# Altium footprint library ALL.PcbLib: 385 footprints (part 20 of 25)
Each footprint in its own frame and in the unit in brackets; x right, y up, seen from the top. Pads: shape width x height; smd on the part's side, far side on the other; paste and mask are expansions set on the pad; w line width, h text height; cw(c..) or ccw(c..) is an arc to the next point about the centre after c.
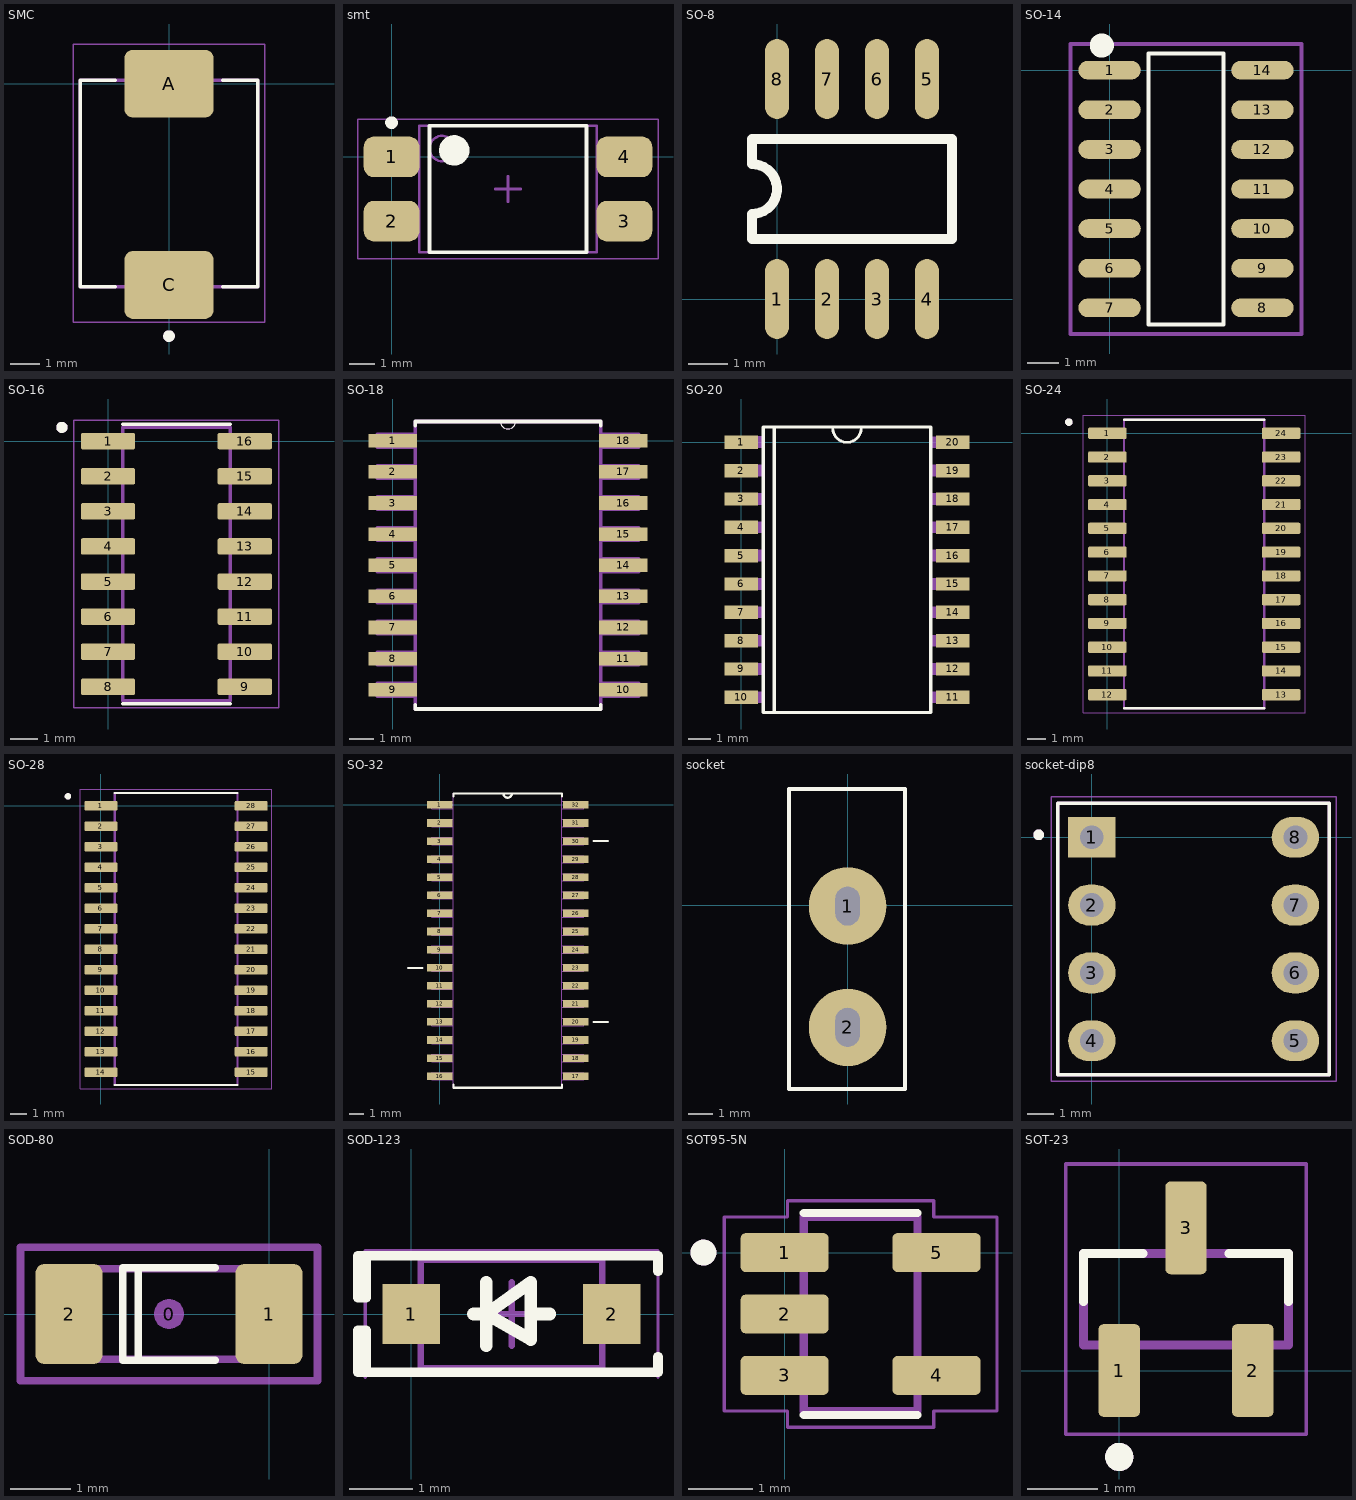
[diagram p19: the footprints below, top view; thin cyan lines are the x and y axes]

## SMC [mm]
pads (2):
  rrect25% 3.07x2.33 smd: A(0,0) C(0,-6.921)
Top Overlay:
  circle w0.2: c0,-8.679 r0.1
  lines w0.127: -1.849,-6.979 -3.05,-6.979 -3.05,0.121 -1.849,0.121 ; 1.849,-6.979 3.05,-6.979 3.05,0.121 1.849,0.121
Mechanical 13:
  circle w0.2: c0,-8.679 r0.1
  lines w0.127: -3.05,-6.979 -3.05,0.121 3.05,0.121 3.05,-6.979 -3.05,-6.979
Mechanical 15:
  lines w0.05: -3.3,-8.209 3.3,-8.209 3.3,1.351 -3.3,1.351 -3.3,-8.209
3D body "b540c-13-f.stp": height 2.25, standoff 0, extent -2.921,-7.526 2.984,0.414

## smt [mm]
pads (4):
  rrect50% 2.2x1.6 smd mask+0.06: 1(0,0) 2(0,-2.54) 3(9.2,-2.54) 4(9.2,0)
Top Overlay:
  circle w0.25: c0,1.35 r0.125
  circle w0.6: c2.475,0.255 r0.3
  lines w0.15: 1.5,-3.77 1.5,1.23 7.7,1.23 7.7,-3.77 1.5,-3.77
Mechanical 13:
  circle w0.1: c2,0.33 r0.5
  lines w0.1: 1.1,-3.77 1.1,1.23 8.1,1.23 8.1,-3.77 1.1,-3.77
Mechanical 15:
  lines w0.05: -1.325,-4.02 -1.325,1.48 10.525,1.48 10.525,-4.02 -1.325,-4.02
  lines w0.1: 4.1,-1.27 5.1,-1.27 ; 4.6,-1.77 4.6,-0.77
3D body "User Library-PC817_Gullwing.STEP": height 3.89, standoff 0.04, extent -0.4,-3.56 9.6,1.02

## SO-8 [mil]
pads (8):
  oval 24x80 smd: 1(0,0) 2(50,0) 3(100,0) 4(150,0) 5(150,220) 6(100,220) 7(50,220) 8(0,220)
Top Overlay:
  lines w10: -25,60 -25,85 ccw(c-25,110) -25,135 -25,160 175,160 175,60 -25,60
3D body "SW3DPS-SO-8 (PIC12FXXX)-DEFAULT.STEP": height 63.6, standoff 0.6, extent -19.8,-12.42 173.11,223.41

## SO-14 [mm]
pads (14):
  oval 2x0.6 smd: 1(0,0) 2(0,-1.27) 3(0,-2.54) 4(0,-3.81) 5(0,-5.08) 6(0,-6.35) 7(0,-7.62) 8(4.9,-7.62) 9(4.9,-6.35) 10(4.9,-5.08) 11(4.9,-3.81) 12(4.9,-2.54) 13(4.9,-1.27) 14(4.9,0)
Top Overlay:
  circle w0.61: c-0.25,0.79 r0.08
  lines w0.127: 1.25,-8.16 1.25,0.54 3.65,0.54 3.65,-8.16 1.25,-8.16
Mechanical 15:
  lines w0.127: -1.25,-8.46 6.15,-8.46 6.15,0.84 -1.25,0.84 -1.25,-8.46
3D body "User Library-SOIC14-150.STEP": height 1.75, standoff 0, extent -0.36,-8.085 5.44,0.465

## SO-16 [mm]
pads (16):
  rrect25% 1.97x0.6 smd: 1(0,0) 2(0,-1.27) 3(0,-2.54) 4(0,-3.81) 5(0,-5.08) 6(0,-6.35) 7(0,-7.62) 8(0,-8.89) 9(4.95,-8.89) 10(4.95,-7.62) 11(4.95,-6.35) 12(4.95,-5.08) 13(4.95,-3.81) 14(4.95,-2.54) 15(4.95,-1.27) 16(4.95,0)
Top Overlay:
  circle w0.2: c-1.67,0.5 r0.1
  lines w0.127: 0.525,-9.51 4.425,-9.51 ; 0.525,0.62 4.425,0.62
Mechanical 13:
  circle w0.2: c-1.67,0.5 r0.1
  lines w0.127: 0.525,-9.395 0.525,0.505 4.425,0.505 4.425,-9.395 0.525,-9.395
Mechanical 15:
  lines w0.05: -1.235,-9.645 -1.235,0.755 6.185,0.755 6.185,-9.645 -1.235,-9.645
3D body "User Library-SOIC-16-1.STEP": height 1.4, standoff 0, extent -0.46,-9.395 5.54,0.505

## SO-18 [mil]
pads (18):
  rect 78x22 smd: 1(0,0) 2(0,-50) 3(0,-100) 4(0,-150) 5(0,-200) 6(0,-250) 7(0,-300) 8(0,-350) 9(0,-400) 10(370,-400) 11(370,-350) 12(370,-300) 13(370,-250) 14(370,-200) 15(370,-150) 16(370,-100) 17(370,-50) 18(370,0)
Top Overlay:
  lines w0: 173,31 ccw(c185,31) 197,31
  lines w6: 36,-424 36,-431 334,-431 334,-424 ; 36,24 36,31 173,31 197,31 334,31 334,24
Mechanical 13:
  lines w0: 173,31 ccw(c185,31) 197,31
  lines w6: -25,-410 36,-410 36,-390 -25,-390 -25,-410 ; -25,-360 36,-360 36,-340 -25,-340 -25,-360 ; -25,-310 36,-310 36,-290 -25,-290 -25,-310 ; -25,-260 36,-260 36,-240 -25,-240 -25,-260 ; -25,-210 36,-210 36,-190 -25,-190 -25,-210 ; -25,-160 36,-160 36,-140 -25,-140 -25,-160 ; -25,-110 36,-110 36,-90 -25,-90 -25,-110 ; -25,-60 36,-60 36,-40 -25,-40 -25,-60 ; -25,-10 36,-10 36,10 -25,10 -25,-10 ; 36,-431 36,31 173,31 197,31 334,31 334,-431 36,-431 ; 334,-410 395,-410 395,-390 334,-390 334,-410 ; 334,-360 395,-360 395,-340 334,-340 334,-360 ; 334,-310 395,-310 395,-290 334,-290 334,-310 ; 334,-260 395,-260 395,-240 334,-240 334,-260 ; 334,-210 395,-210 395,-190 334,-190 334,-210 ; 334,-160 395,-160 395,-140 334,-140 334,-160 ; 334,-110 395,-110 395,-90 334,-90 334,-110 ; 334,-60 395,-60 395,-40 334,-40 334,-60 ; 334,-10 395,-10 395,10 334,10 334,-10
3D body "82YWM--3DModel-STEP-56544.STEP": height 102.99, standoff 0, extent -18,-428.49 388.02,28.51

## SO-20 [mm]
pads (20):
  rect 1.5x0.6 smd: 1(0,0) 2(0,-1.27) 3(0,-2.54) 4(0,-3.81) 5(0,-5.08) 6(0,-6.35) 7(0,-7.62) 8(0,-8.89) 9(0,-10.16) 10(0,-11.43) 11(9.5,-11.43) 12(9.5,-10.16) 13(9.5,-8.89) 14(9.5,-7.62) 15(9.5,-6.35) 16(9.5,-5.08) 17(9.5,-3.81) 18(9.5,-2.54) 19(9.5,-1.27) 20(9.5,0)
Top Overlay:
  lines w0.127: 4.115,0.635 ccw(c4.75,0.635) 5.385,0.635
  lines w0.152: 1.48,-12.115 1.48,0.685 ; 1.48,-12.115 8.5,-12.115 8.5,0.685 1.48,0.685 ; 1.48,-12.115 1,-12.115 1,0.685 1.48,0.685
Mechanical 13:
  region: -0.008,-0.254 -0.008,0.264 1,0.264 1,-0.254
  region: -0.002,-11.684 -0.002,-11.178 1,-11.178 1,-11.684
  region: 8.504,-0.254 8.504,0.261 9.5,0.261 9.5,-0.254
  region: 8.506,-11.684 8.506,-11.185 9.5,-11.185 9.5,-11.684
  region: -0.006,-10.414 -0.006,-9.911 1,-9.911 1,-10.414
  region: -0.007,-9.144 -0.007,-8.641 1,-8.641 1,-9.144
  region: -0.008,-7.874 -0.008,-7.369 1,-7.369 1,-7.874
  region: -0.009,-6.604 -0.009,-6.097 1,-6.097 1,-6.604
  region: -0.001,-1.524 -0.001,-1.015 1,-1.015 1,-1.524
  region: -0.003,-2.794 -0.003,-2.284 1,-2.284 1,-2.794
  region: -0.002,-4.064 -0.002,-3.555 1,-3.555 1,-4.064
  region: -0.003,-5.334 -0.003,-4.825 1,-4.825 1,-5.334
  region: 8.502,-10.414 8.502,-9.908 9.5,-9.908 9.5,-10.414
  region: 8.503,-9.144 8.503,-8.638 9.5,-8.638 9.5,-9.144
  region: 8.502,-7.874 8.502,-7.367 9.5,-7.367 9.5,-7.874
  region: 8.501,-6.604 8.501,-6.096 9.5,-6.096 9.5,-6.604
  region: 8.502,-1.524 8.502,-1.013 9.5,-1.013 9.5,-1.524
  region: 8.507,-2.794 8.507,-2.279 9.5,-2.279 9.5,-2.794
  region: 8.505,-4.064 8.505,-3.553 9.5,-3.553 9.5,-4.064
  region: 8.503,-5.334 8.503,-4.825 9.5,-4.825 9.5,-5.334
3D body "User Library-SOIC20.STEP": height 2.32, standoff 0.08, extent -0.368,-12.142 9.766,0.458

## SO-24 [mm]
pads (24):
  rrect25% 2.06x0.6 smd: 1(0,0) 2(0,-1.27) 3(0,-2.54) 4(0,-3.81) 5(0,-5.08) 6(0,-6.35) 7(0,-7.62) 8(0,-8.89) 9(0,-10.16) 10(0,-11.43) 11(0,-12.7) 12(0,-13.97) 13(9.28,-13.97) 14(9.28,-12.7) 15(9.28,-11.43) 16(9.28,-10.16) 17(9.28,-8.89) 18(9.28,-7.62) 19(9.28,-6.35) 20(9.28,-5.08) 21(9.28,-3.81) 22(9.28,-2.54) 23(9.28,-1.27) 24(9.28,0)
Top Overlay:
  circle w0.2: c-2.06,0.6 r0.1
  lines w0.127: 0.89,-14.685 8.39,-14.685 ; 0.89,0.715 8.39,0.715
Mechanical 13:
  circle w0.2: c-2.06,0.6 r0.1
  lines w0.127: 0.89,-14.685 0.89,0.715 8.39,0.715 8.39,-14.685 0.89,-14.685
Mechanical 15:
  lines w0.05: -1.28,-14.935 -1.28,0.965 10.56,0.965 10.56,-14.935 -1.28,-14.935
3D body "User Library-SOIC_24-300.STEP": height 2.6, standoff 0, extent -0.508,-14.812 9.892,0.588

## SO-28 [mm]
pads (28):
  rrect25% 2.05x0.59 smd: 1(0,0) 2(0,-1.27) 3(0,-2.54) 4(0,-3.81) 5(0,-5.08) 6(0,-6.35) 7(0,-7.62) 8(0,-8.89) 9(0,-10.16) 10(0,-11.43) 11(0,-12.7) 12(0,-13.97) 13(0,-15.24) 14(0,-16.51) 15(9.31,-16.51) 16(9.31,-15.24) 17(9.31,-13.97) 18(9.31,-12.7) 19(9.31,-11.43) 20(9.31,-10.16) 21(9.31,-8.89) 22(9.31,-7.62) 23(9.31,-6.35) 24(9.31,-5.08) 25(9.31,-3.81) 26(9.31,-2.54) 27(9.31,-1.27) 28(9.31,0)
Top Overlay:
  circle w0.2: c-2.05,0.59 r0.1
  lines w0.127: 0.855,-17.305 8.455,-17.305 ; 0.855,0.795 8.455,0.795
Mechanical 13:
  circle w0.2: c-2.05,0.59 r0.1
  lines w0.127: 0.855,-17.305 8.455,-17.305 8.455,0.795 0.855,0.795 0.855,-17.305
Mechanical 15:
  lines w0.05: -1.275,-17.555 10.585,-17.555 10.585,1.045 -1.275,1.045 -1.275,-17.555
3D body "User Library-SOIC28-300.STEP": height 2.65, standoff 0, extent -0.578,-17.205 9.722,0.695

## SO-32 [mil]
pads (32):
  rect 71x21 smd: 1(0,-1) 2(0,-51) 3(0,-101) 4(0,-151) 5(0,-201) 6(0,-251) 7(0,-301) 8(0,-351) 9(0,-401) 10(0,-451) 11(0,-501) 12(0,-551) 13(0,-601) 14(0,-651) 15(0,-701) 16(0,-751) 17(376,-751) 18(376,-701) 19(376,-651) 20(376,-601) 21(376,-551) 22(376,-501) 23(376,-451) 24(376,-401) 25(376,-351) 26(376,-301) 27(376,-251) 28(376,-201) 29(376,-151) 30(376,-101) 31(376,-51) 32(376,-1)
Top Overlay:
  lines w6: -87,-452 -48,-452 ; 38,-774 38,-783 338,-783 338,-774 ; 38,22 38,31 176,31 ; 338,22 338,31 200,31 ; 425,-601 465,-601 ; 425,-101 465,-101 ; 176,31 ccw(c188,31) 200,31 ; 176,31 200,31
Mechanical 13:
  lines w0: 176,31 ccw(c188,31) 200,31 ; 176,31 38,31 38,-783 338,-783 338,31 200,31 ; 176,31 200,31 ; -22,-761 38,-761 38,-741 -22,-741 -22,-761 ; -22,-711 38,-711 38,-691 -22,-691 -22,-711 ; -22,-661 38,-661 38,-641 -22,-641 -22,-661 ; -22,-611 38,-611 38,-591 -22,-591 -22,-611 ; -22,-561 38,-561 38,-541 -22,-541 -22,-561 ; -22,-511 38,-511 38,-491 -22,-491 -22,-511 ; -22,-461 38,-461 38,-441 -22,-441 -22,-461 ; -22,-411 38,-411 38,-391 -22,-391 -22,-411 ; -22,-361 38,-361 38,-341 -22,-341 -22,-361 ; -22,-311 38,-311 38,-291 -22,-291 -22,-311 ; -22,-261 38,-261 38,-241 -22,-241 -22,-261 ; -22,-211 38,-211 38,-191 -22,-191 -22,-211 ; -22,-161 38,-161 38,-141 -22,-141 -22,-161 ; -22,-111 38,-111 38,-91 -22,-91 -22,-111 ; -22,-61 38,-61 38,-41 -22,-41 -22,-61 ; -22,-11 38,-11 38,9 -22,9 -22,-11 ; 338,-761 398,-761 398,-741 338,-741 338,-761 ; 338,-711 398,-711 398,-691 338,-691 338,-711 ; 338,-661 398,-661 398,-641 338,-641 338,-661 ; 338,-611 398,-611 398,-591 338,-591 338,-611 ; 338,-561 398,-561 398,-541 338,-541 338,-561 ; 338,-511 398,-511 398,-491 338,-491 338,-511 ; 338,-461 398,-461 398,-441 338,-441 338,-461 ; 338,-411 398,-411 398,-391 338,-391 338,-411 ; 338,-361 398,-361 398,-341 338,-341 338,-361 ; 338,-311 398,-311 398,-291 338,-291 338,-311 ; 338,-261 398,-261 398,-241 338,-241 338,-261 ; 338,-211 398,-211 398,-191 338,-191 338,-211 ; 338,-161 398,-161 398,-141 338,-141 338,-161 ; 338,-111 398,-111 398,-91 338,-91 338,-111 ; 338,-61 398,-61 398,-41 338,-41 338,-61 ; 338,-11 398,-11 398,9 338,9 338,-11

## socket [mm]
pads (2):
  round 3.2 hole 1 slot 1.6 at 90 deg mask+0.254: 1(0,-0.025) 2(0,-5.025)
Top Overlay:
  region: -0.254,0.229 -0.254,-0.279 0.254,-0.279 0.254,0.229
  lines w0.152: -2.413,-7.569 -2.413,-2.184 -2.413,4.801 2.362,4.801 2.362,-0.33 2.362,-2.616 2.362,-7.569 -2.413,-7.569
3D body "019.68.162.stp": height 9, standoff -2.5, extent -0.378,-6.489 0.432,8.471

## socket-dip8 [mil]
pads (8):
  rect 70x60 hole 35: 1(0,0)
  oval 70x60 hole 35: 2(0,-100) 3(0,-200) 4(0,-300) 5(300,-300) 6(300,-200) 7(300,-100) 8(300,0)
Top Overlay:
  circle w7.87: c-78.35,3.54 r3.94
  lines w5: -50,-350 -50,50 350,50 350,-350 -50,-350
Mechanical 13:
  circle w7.87: c-78.35,3.54 r3.94
  lines w5: -50,-350 -50,50 350,50 350,-350 -50,-350
Mechanical 15:
  lines w1.97: -59.84,-359.84 -59.84,59.84 359.84,59.84 359.84,-359.84 -59.84,-359.84
3D body "2-1571552-2.stp": height 110, standoff -180, extent -48,-346 348,50

## SOD-80 [mm]
pads (3):
  round 0.5 on Mech15: 0(-1.65,0)
  rrect25% 1.1x1.65 smd: 1(0,0) 2(-3.3,0)
Top Overlay:
  lines w0.127: -2.158,-0.762 -2.158,0.762 ; -0.888,-0.762 -2.412,-0.762 -2.412,0.762 -0.888,0.762
Mechanical 13:
  lines w0.127: -3.45,-0.747 0.15,-0.747 0.15,0.747 -3.45,0.747 -3.45,-0.747
Mechanical 15:
  lines w0.127: -4.1,-1.1 0.8,-1.1 0.8,1.1 -4.1,1.1 -4.1,-1.1

## SOD-123 [mm]
pads (2):
  rect 0.9x0.95 smd: 1(0,0) 2(3.15,0)
Top Overlay:
  lines w0.15: 3.875,-0.675 3.875,-0.916 -0.711,-0.916 ; 3.875,0.675 3.875,0.916 -0.711,0.916 ; -0.711,-0.916 -0.711,-0.254 -0.838,-0.254 -0.838,-0.916 -0.711,-0.916 ; -0.711,0.916 -0.838,0.916 -0.838,0.254 -0.711,0.254 -0.711,0.916
  lines w0.2: 0.975,0 1.175,0 ; 1.175,-0.5 1.175,0.5 ; 1.875,0 2.175,0 ; 1.175,0 1.875,-0.4 1.875,0.5 1.175,0
Mechanical 13:
  lines w0.1: 0.15,-0.85 0.15,0.85 3,0.85 3,-0.85 0.15,-0.85
Mechanical 15:
  lines w0.05: -0.725,-1 -0.725,1 3.875,1 3.875,-1 ; -0.725,-0.9 3.875,-0.9
  lines w0.1: 1.075,0 2.075,0 ; 1.575,-0.5 1.575,0.5
3D body "SOD-123.STEP": height 1.35, standoff 0, extent -0.289,-0.775 3.439,0.775

## SOT95-5N [mm]
pads (5):
  rrect25% 1.36x0.6 smd: 1(0,0) 2(0,-0.95) 3(0,-1.9) 4(2.35,-1.9) 5(2.35,0)
Top Overlay:
  circle w0.2: c-1.255,0 r0.1
  lines w0.127: 0.295,-2.514 2.055,-2.514 ; 0.295,0.614 2.055,0.614
Mechanical 13:
  circle w0.2: c-1.255,0 r0.1
  lines w0.127: 0.295,-2.45 0.295,0.55 2.055,0.55 2.055,-2.45 0.295,-2.45
Mechanical 15:
  lines w0.05: -0.935,-2.45 0.045,-2.45 0.045,-2.7 2.305,-2.7 2.305,-2.45 3.285,-2.45 3.285,0.55 2.305,0.55 2.305,0.8 0.045,0.8 0.045,0.55 -0.935,0.55 -0.935,-2.45
3D body "step_temp.STEP": height 1.45, standoff 0, extent -0.225,-2.4 2.575,0.5

## SOT-23 [mm]
pads (3):
  rrect25% 0.59x1.32 smd: 1(0,0) 2(1.9,0) 3(0.95,2.03)
Top Overlay:
  circle w0.2: c0,-1.231 r0.1
  lines w0.127: -0.51,0.98 -0.51,1.665 0.335,1.665 ; 1.565,1.665 2.41,1.665 2.41,0.98
Mechanical 13:
  circle w0.2: c0,-1.231 r0.1
  lines w0.127: -0.51,0.365 2.41,0.365 2.41,1.665 -0.51,1.665 -0.51,0.365
Mechanical 15:
  lines w0.05: -0.76,-0.91 2.66,-0.91 2.66,2.94 -0.76,2.94 -0.76,-0.91
3D body "BAS19 RF.STEP": height 1.3, standoff 0, extent -0.5,-0.424 2.4,1.946